# Altium footprint library XU-GENARAL PCB .PcbLib: 1176 footprints (part 60 of 75)
Each footprint in its own frame and in the unit in brackets; x right, y up, seen from the top. Pads: shape width x height; smd on the part's side, far side on the other; paste and mask are expansions set on the pad; w line width, h text height; cw(c..) or ccw(c..) is an arc to the next point about the centre after c.
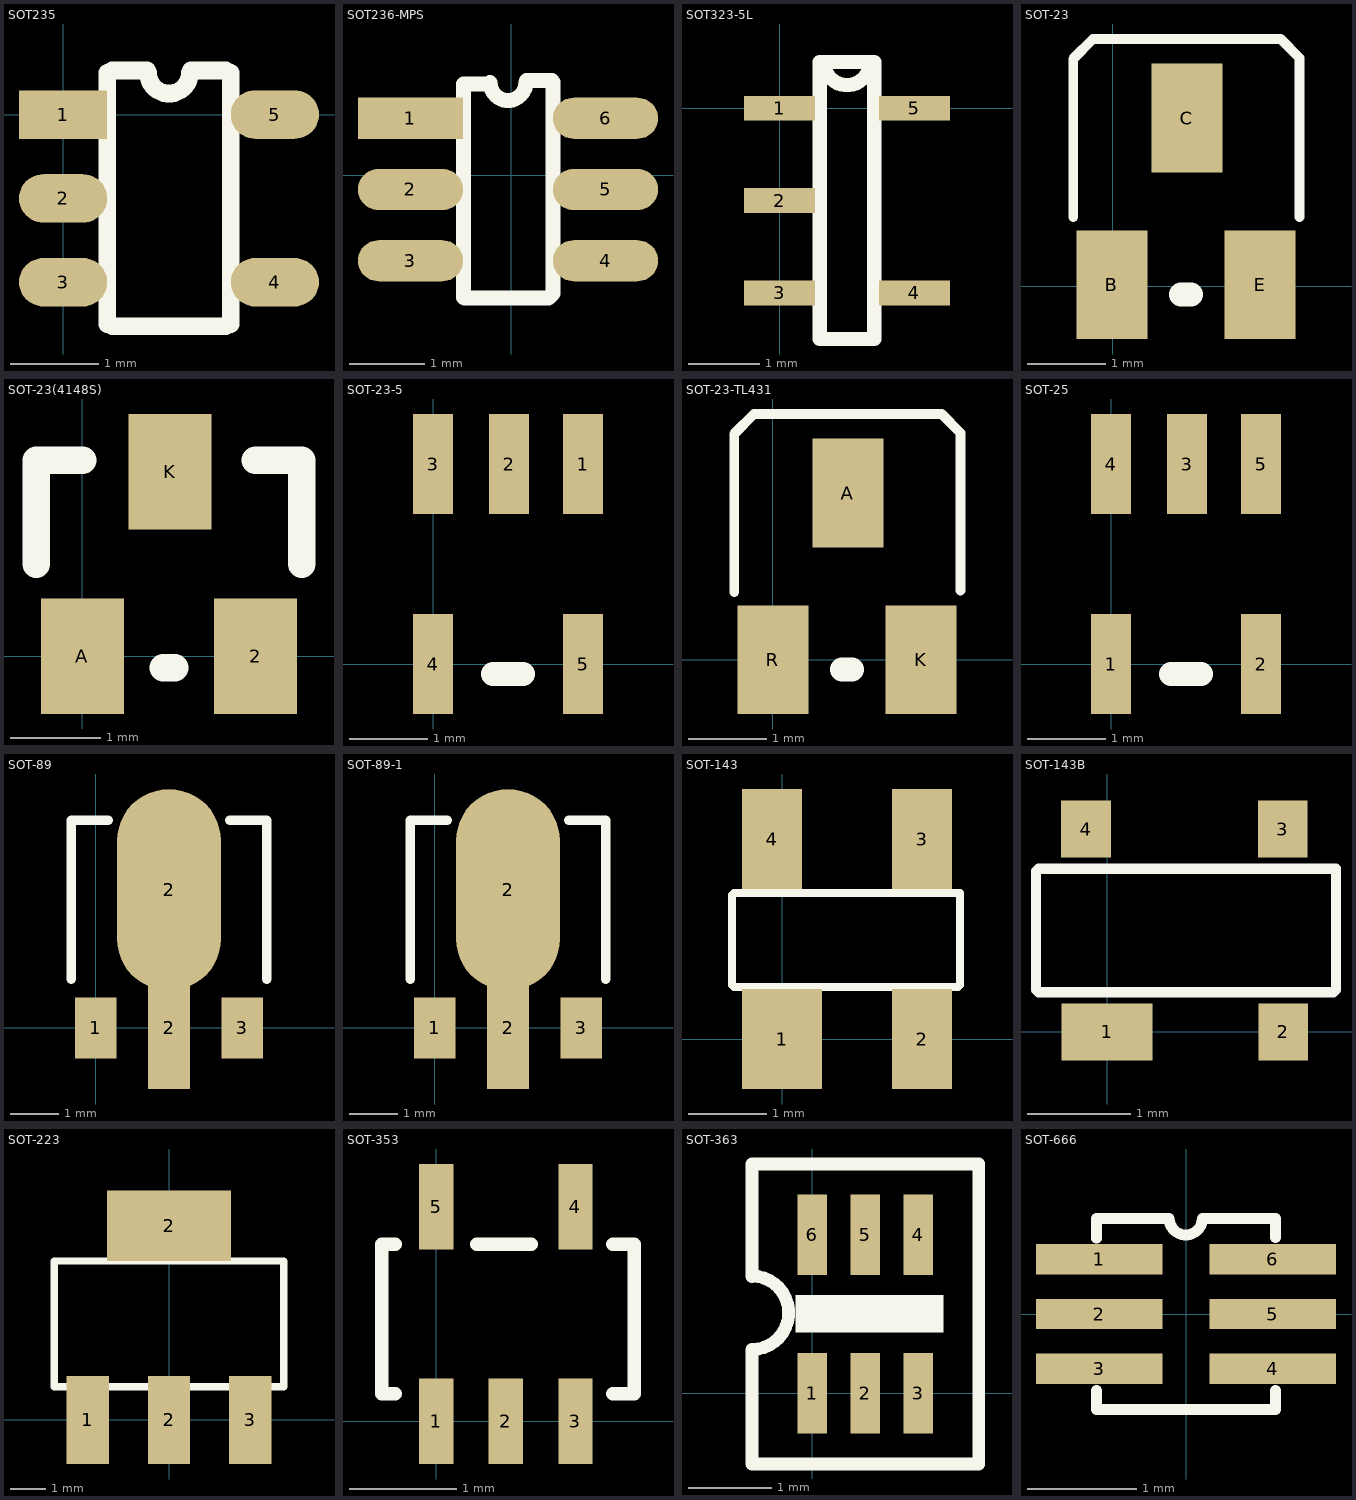
[diagram p59: the footprints below, top view; thin cyan lines are the x and y axes]

## SOT235 [mm]
height 1.1
pads (5):
  rect 1x0.55 smd: 1(0,0)
  oval 1x0.55 smd: 2(0,-0.95) 3(0,-1.9) 4(2.4,-1.9) 5(2.4,0)
Top Overlay:
  lines w0.2: 0.5,-2.375 0.5,0.475 ; 0.557,-2.4 1.843,-2.4 ; 0.557,0.5 0.95,0.5 ; 0.963,0.475 ccw(c1.2,0.475) 1.437,0.475 ; 1.45,0.5 1.843,0.5 ; 1.9,-2.375 1.9,0.475

## SOT236-MPS [mm]
pads (6):
  rect 1.4x0.55 smd: 1(-1.344,0.762)
  oval 1.4x0.55 smd: 2(-1.344,-0.188) 3(-1.344,-1.138) 4(1.256,-1.138) 5(1.256,-0.188) 6(1.256,0.762)
Top Overlay:
  lines w0.2: -0.305,1.219 -0.635,1.219 -0.635,-1.626 -0.623,-1.638 0.496,-1.638 0.559,-1.575 0.559,1.245 0.541,1.262 0.205,1.262 ; -0.282,1.237 ccw(c-0.045,1.237) 0.193,1.237

## SOT323-5L [mm]
pads (5):
  rect 1x0.35 smd: 1(0,0) 2(0,-1.3) 3(0,-2.6) 4(1.9,-2.6) 5(1.9,0)
Top Overlay:
  lines w0.2: 0.565,-3.25 0.565,0.65 1.275,0.65 cw(c0.95,0.65) 0.625,0.65 1.335,0.65 1.335,-3.25 0.565,-3.25

## SOT-23 [mil]
pads (3):
  rect 36x55 smd: B(-0.42,0.69) C(37.58,85) E(74.58,0.69)
Top Overlay:
  lines w5: -20,35 -20,115 -10,125 85,125 94.58,115.42 94.58,35
  lines w12: 34.58,-4.31 39.58,-4.31

## SOT-23(4148S) [mil]
pads (3):
  rect 36x50 smd: 2(75,0) A(0,0) K(38,80)
Top Overlay:
  lines w12: -20,40 -20,85 0,85 ; 35,-5 40,-5 ; 75,85 95,85 95,40

## SOT-23-5 [mil]
pads (5):
  rect 20x50 smd: 1(75,100) 2(38,100) 3(0,100) 4(0,0) 5(75,0)
Top Overlay:
  lines w12: 30,-5 45,-5

## SOT-23-TL431 [mil]
pads (3):
  rect 36x55 smd: A(38,84.31) K(75,0) R(0,0)
Top Overlay:
  lines w5: -19.58,34.31 -19.58,114.31 -9.58,124.31 85.42,124.31 95,114.73 95,35
  lines w12: 35,-5 40,-5

## SOT-25 [mil]
pads (5):
  rect 20x50 smd: 1(0,0) 2(75,0) 3(38,100) 4(0,100) 5(75,100)
Top Overlay:
  lines w12: 30,-5 45,-5

## SOT-89 [mil]
pads (4):
  rect 34x50 smd: 1(0,0) 3(120,0)
  rect 34x100 smd: 2(60,0)
  oval 85x165 smd: 2(60,113)
Top Overlay:
  lines w8: -20,40 -20,170 10,170 ; 110,170 140,170 140,40

## SOT-89-1 [mil]
pads (4):
  rect 34x50 smd: 1(0,0) 3(120,0)
  rect 34x100 smd: 2(60,0)
  oval 85x165 smd: 2(60,113)
Top Overlay:
  lines w8: -20,40 -20,170 10,170 ; 110,170 140,170 140,40

## SOT-143 [mil]
pads (4):
  rect 40x50 smd: 1(0,0)
  rect 30x50 smd: 2(70,0) 3(70,100) 4(-5,100)
Top Overlay:
  lines w1: -25,27 -24,26 ; -25,72 -24,73 ; 88,26 89,27
  lines w3.94: -25,27 -25,72 ; -24,26 88,26 ; -24,73 89,73 89,27

## SOT-143B [mm]
pads (4):
  rect 0.88x0.55 smd: 1(0,0)
  rect 0.48x0.55 smd: 2(1.702,0) 3(1.697,1.956) 4(-0.203,1.956)
Top Overlay:
  lines w0.025: -0.686,0.406 -0.66,0.381 ; -0.686,1.549 -0.66,1.575 ; 2.184,0.381 2.21,0.406
  lines w0.1: -0.686,0.406 -0.686,1.549 ; -0.66,0.381 2.184,0.381 ; -0.66,1.575 2.21,1.575 2.21,0.406

## SOT-223 [mm]
pads (4):
  rect 1.2x2.5 smd: 1(-2.3,0) 2(0,0) 3(2.3,0)
  rect 3.5x2 smd: 2(0,5.5)
Top Overlay:
  lines w0.203: -3.25,0.94 3.25,0.94 3.25,4.5 -3.25,4.5 -3.25,0.94

## SOT-353 [mm]
pads (5):
  rect 0.32x0.8 smd: 1(0,0) 2(0.65,0) 3(1.3,0) 4(1.3,2) 5(0,2)
Top Overlay:
  lines w0.127: -0.381,0.254 -0.508,0.254 -0.508,1.651 -0.381,1.651 ; 0.381,1.651 0.889,1.651 ; 1.651,0.254 1.85,0.254 1.85,1.651 1.651,1.651

## SOT-363 [mil]
pads (6):
  rect 14x38 smd: 1(0,0) 2(25,0) 3(50,0) 4(50,74.8) 5(25,74.8) 6(0,74.8)
Top Overlay:
  rectangle: -7.87,28.54 62.01,46.26
  lines w6: -28.54,55.12 -28.54,108.26 78.54,108.26 ; -28.54,55.31 cw(c-28.54,37.99) -28.54,20.67 -28.54,-33.47 78.54,-33.47 78.54,107.28

## SOT-666 [mm]
pads (6):
  rect 1.16x0.279 smd: 1(-0.795,0.5) 2(-0.795,0) 3(-0.795,-0.5) 4(0.795,-0.5) 5(0.795,0) 6(0.795,0.5)
Top Overlay:
  lines w0.1: -0.821,-0.703 -0.821,-0.877 0.821,-0.877 0.821,-0.703 ; -0.821,0.694 -0.821,0.877 -0.154,0.877 ccw(c-0.002,0.877) 0.15,0.877 0.821,0.877 0.821,0.703
3D body: height 0.6, standoff 0, extent -0.871,-0.927 0.871,0.927